# Altium footprint library M_Derogarian Altium Library.PcbLib: 137 footprints (part 5 of 9)
Each footprint in its own frame and in the unit in brackets; x right, y up, seen from the top. Pads: shape width x height; smd on the part's side, far side on the other; paste and mask are expansions set on the pad; w line width, h text height; cw(c..) or ccw(c..) is an arc to the next point about the centre after c.
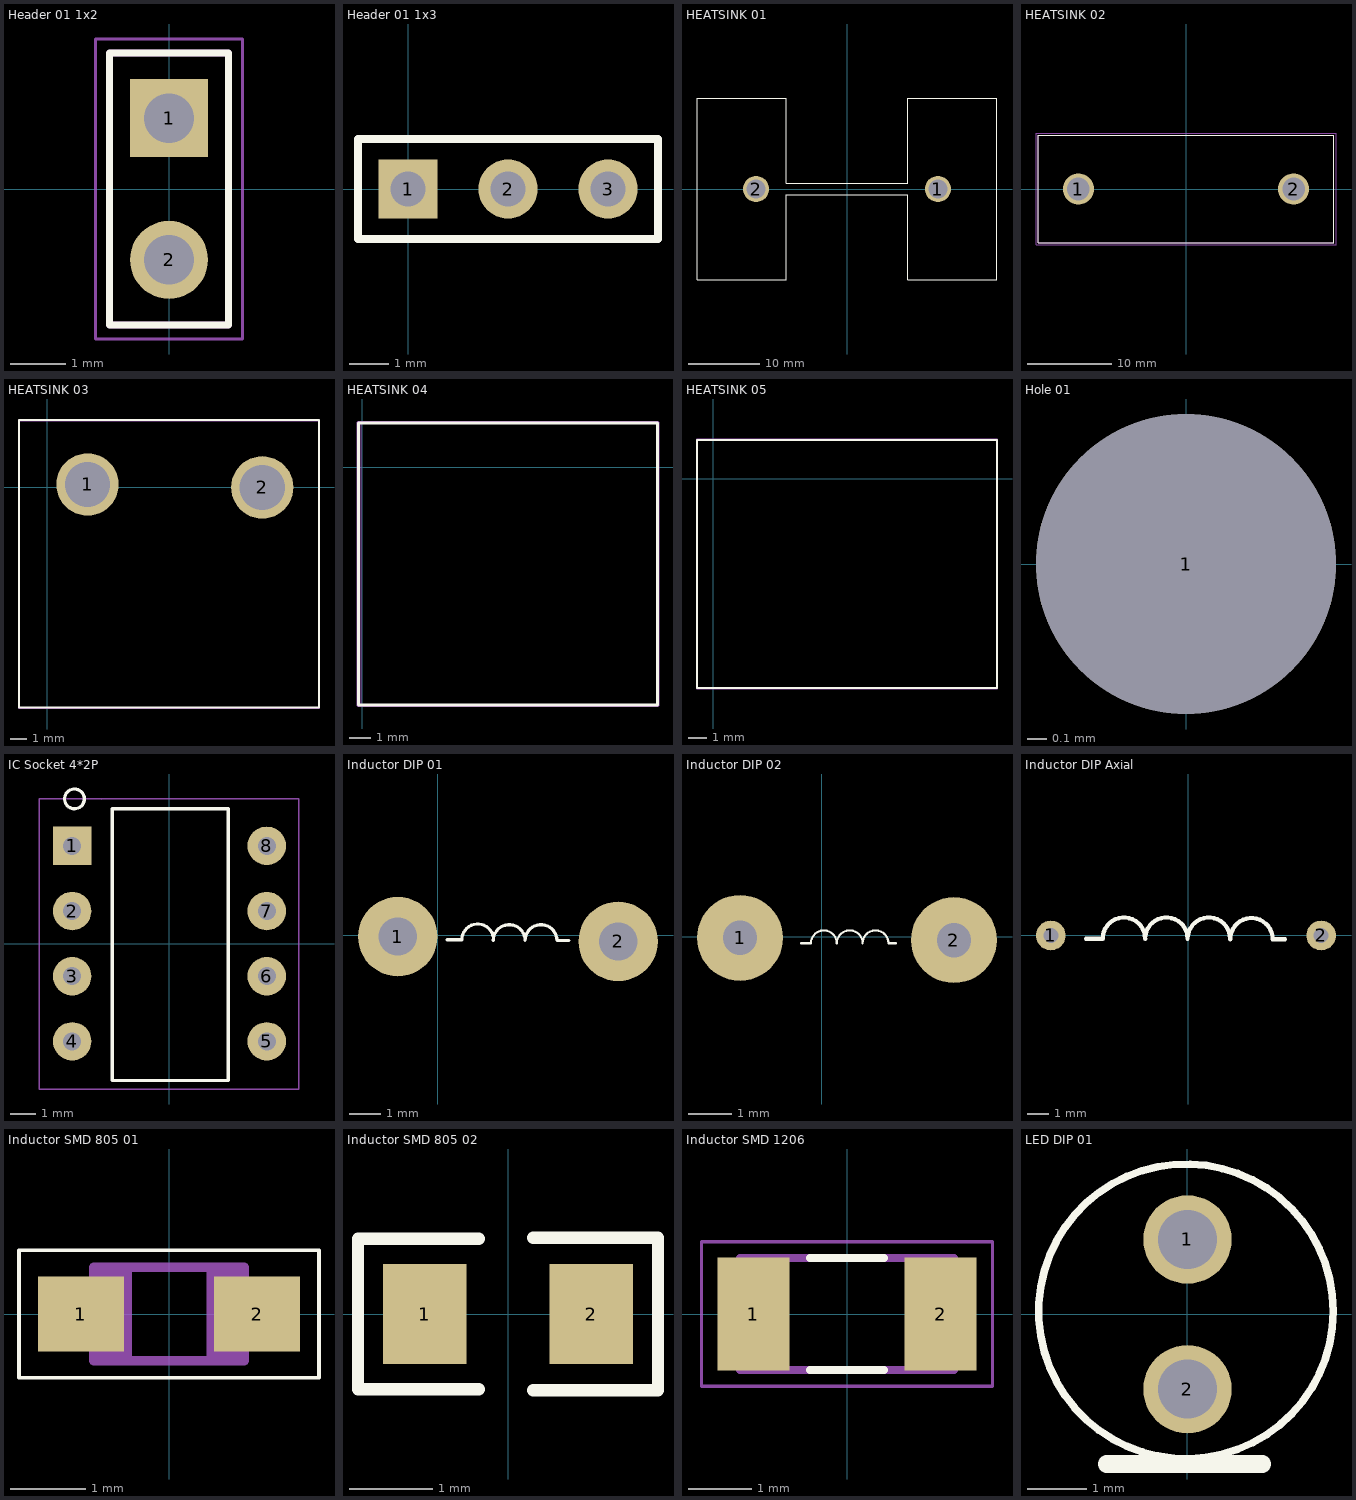
[diagram p4: the footprints below, top view; thin cyan lines are the x and y axes]

## Header 01 1x2 [mm]
pads (2):
  rect 1.398x1.398 hole 0.89: 1(0,1.27)
  round 1.398 hole 0.89: 2(0,-1.27)
Top Overlay:
  lines w0.127: -1.07,-2.44 1.07,-2.44 1.07,2.44 -1.07,2.44 -1.07,-2.44
Mechanical 13:
  lines w0.127: -1.07,-2.44 1.07,-2.44 1.07,2.44 -1.07,2.44 -1.07,-2.44
Mechanical 15:
  lines w0.05: -1.32,-2.69 1.32,-2.69 1.32,2.69 -1.32,2.69 -1.32,-2.69
3D body "5-146252-1--3DModel-STEP-1.STEP": height 11.08, standoff -2.46, extent -1.07,-2.438 1.064,2.438

## Header 01 1x3 [mm]
pads (3):
  rect 1.5x1.5 hole 0.9: 1(0,0)
  round 1.5 hole 0.9: 2(2.54,0) 3(5.08,0)
Top Overlay:
  lines w0.2: -1.27,-1.27 -1.27,1.27 6.35,1.27 6.35,-1.27 -1.27,-1.27
3D body "User Library-SMW250-03.STEP": height 7, standoff -3.5, extent -2.37,-3.489 7.53,2.9

## HEATSINK 01 [mil]
pads (2):
  round 143 hole 103: 1(500,0) 2(-500,0)
Top Overlay:
  lines w5: -825,-500 -335,-500 -335,-31 335,-31 335,-500 825,-500 825,500 335,500 335,31 -335,31 -335,500 -825,500 -825,-500
3D body "step_temp.STEP": height 2500, standoff -155.91, extent -825,-500 825,500

## HEATSINK 02 [mm]
height 38.1
pads (2):
  round 3.686 hole 2.67: 1(-12.7,0) 2(12.7,0)
Top Overlay:
  lines w0.127: -17.46,-6.35 -17.46,6.35 17.46,6.35 17.46,-6.35 -17.46,-6.35
Mechanical 13:
  lines w0.127: -17.46,-6.35 -17.46,6.35 17.46,6.35 17.46,-6.35 -17.46,-6.35
Mechanical 15:
  lines w0.05: -17.71,-6.6 -17.71,6.6 17.71,6.6 17.71,-6.6 -17.71,-6.6
3D body "step_temp.STEP": height 38.1, standoff -3.96, extent -17.46,-6.35 17.465,6.35

## HEATSINK 03 [mm]
height 38.1
pads (2):
  round 3.686 hole 2.67: 1(2.375,0.175) 2(12.7,0)
Top Overlay:
  lines w0.127: -1.675,-13 16.05,-13 16.05,3.975 -1.675,3.975 -1.675,-13
Mechanical 13:
  lines w0.127: -1.675,-13.025 16.05,-13.025 16.05,3.95 -1.675,3.95 -1.675,-13.025
Mechanical 15:
  lines w0.05: -1.675,-13 16.025,-13 16.025,3.925 -1.675,3.925 -1.675,-13
3D body "User Library-TO220_H25xW17xD16.STEP": height 25, standoff -3, extent -1.2,-12.775 15.6,3.225

## HEATSINK 04 [mm]
height 38.1
Top Overlay:
  lines w0.127: -0.175,-11.15 -0.175,2.075 13.85,2.075 13.85,-11.15 -0.175,-11.15
Mechanical 13:
  lines w0.127: -0.2,-11.175 -0.2,2.1 13.875,2.1 13.875,-11.175 -0.2,-11.175
Mechanical 15:
  lines w0.05: -0.05,-11.15 -0.05,2.075 13.85,2.075 13.85,-11.15 -0.05,-11.15
3D body "v7237c1.stp": height 19.05, standoff 0, extent 0.265,-10.85 13.475,1.85

## HEATSINK 05 [mm]
height 38.1
Top Overlay:
  lines w0.127: -0.875,-11.15 -0.875,2.075 15.125,2.075 15.125,-11.15 -0.875,-11.15
Mechanical 13:
  lines w0.127: -0.875,-11.175 -0.875,2.1 15.125,2.1 15.125,-11.175 -0.875,-11.175
Mechanical 15:
  lines w0.05: -0.85,-11.15 -0.85,2.075 15.125,2.075 15.125,-11.15 -0.85,-11.15
3D body "User Library-Heatsink-57AS.STEP": height 25, standoff 0, extent -0.625,-10.45 14.675,1.81

## Hole 01 [mil]
pads (1):
  round 60 hole 60 mask+4: 1(0,0)

## IC Socket 4*2P [mm]
pads (8):
  rect 1.5x1.5 hole 0.7: 1(-3.793,3.81)
  round 1.5 hole 0.7: 2(-3.793,1.27) 3(-3.793,-1.27) 4(-3.793,-3.81) 5(3.793,-3.81) 6(3.793,-1.27) 7(3.793,1.27) 8(3.793,3.81)
Top Overlay:
  circle w0.127: c-3.7,5.639 r0.386
  lines w0.127: 2.269,-5.334 -2.227,-5.334 -2.227,5.258 2.294,5.258 2.294,-5.334
Mechanical 15:
  lines w0.05: -2.674,5.623 -2.659,5.639 ; -5.072,-5.664 5.037,-5.664 5.037,5.639 -5.072,5.639 -5.072,-5.664
3D body "a_08-lc-tt.stp": height 6, standoff -2.25, extent -5.004,-5.105 5.156,5.055

## Inductor DIP 01 [mm]
height 2.54
pads (2):
  round 2.5 hole 1.2: 1(-1.25,-0.05) 2(5.675,-0.2)
Top Overlay:
  lines w0.1: 0.3,-0.15 0.75,-0.15 ; 0.761,-0.152 cw(c1.261,-0.152) 1.761,-0.152 ; 1.75,-0.175 cw(c2.25,-0.175) 2.75,-0.175 cw(c3.25,-0.175) 3.75,-0.175 4.125,-0.175
3D body "7447016.stp": height 18.82, standoff -12.8, extent -1.895,-8.869 6.645,8.518

## Inductor DIP 02 [mm]
height 2.54
pads (2):
  round 2 hole 0.8: 1(-1.9,-0.025) 2(3.075,-0.075)
Top Overlay:
  lines w0.05: -0.475,-0.15 -0.25,-0.15 cw(c0.05,-0.15) 0.35,-0.15 cw(c0.65,-0.15) 0.95,-0.15 cw(c1.25,-0.15) 1.55,-0.15 1.725,-0.15
3D body "User Library-Inductors  9x11.STEP": height 11.16, standoff -3, extent -3.434,-4.168 4.634,3.9

## Inductor DIP Axial [mm]
height 2.54
pads (2):
  round 1.4 hole 0.7: 1(-6.477,0) 2(6.248,0)
Top Overlay:
  lines w0.2: -4.826,-0.152 -4.04,-0.152 ; -4.039,-0.152 cw(c-3.039,-0.152) -2.039,-0.152 cw(c-1.039,-0.152) -0.039,-0.152 cw(c0.961,-0.152) 1.961,-0.152 ; 1.968,-0.178 cw(c2.968,-0.178) 3.968,-0.178 ; 3.962,-0.178 4.547,-0.178
3D body "User Library-Axial SMT Inductor Right Angle.STEP": height 4.95, standoff -4, extent -6.776,-1.147 6.624,3.353

## Inductor SMD 805 01 [mm]
pads (2):
  rect 1.15x1 smd: 1(-1.175,0) 2(1.175,0)
Top Overlay:
  lines w0.051: -2,-0.85 -2,0.85 2,0.85 2,-0.85 -2,-0.85
Mechanical 13:
  region: 1,-0.626 0.501,-0.626 0.501,0.625 1,0.625
  region: -0.5,-0.626 -1.001,-0.626 -1.001,0.625 -0.5,0.625
  lines w0.127: -1,-0.625 -1,0.625 1,0.625 1,-0.625 -1,-0.625
3D body "MLF2012K390M.STEP": height 1.04, standoff -0.01, extent -0.924,-0.6 1.076,0.65

## Inductor SMD 805 02 [mm]
pads (2):
  rect 1x1.2 smd: 1(-1,0) 2(1,0)
Top Overlay:
  lines w0.15: -0.35,-0.9 -1.8,-0.9 -1.8,0.9 -0.35,0.9 ; 0.3,-0.916 1.8,-0.916 1.8,0.916 0.3,0.916
3D body "User Library-RES_2013-0805.STEP": height 0.76, standoff 0, extent -1.15,-0.675 1.15,0.675

## Inductor SMD 1206 [mm]
pads (2):
  rect 1.13x1.77 smd: 1(-1.47,0) 2(1.47,0)
Top Overlay:
  lines w0.127: -0.58,-0.88 0.58,-0.88 ; -0.58,0.88 0.58,0.88
Mechanical 13:
  lines w0.127: -1.68,-0.88 -1.68,0.88 1.68,0.88 1.68,-0.88 -1.68,-0.88
Mechanical 15:
  lines w0.05: -2.285,-1.135 -2.285,1.135 2.285,1.135 2.285,-1.135 -2.285,-1.135
3D body "User Library-RESC3216X06N.STEP": height 0.55, standoff 0, extent -1.625,-0.774 1.575,0.826

## LED DIP 01 [mm]
pads (2):
  round 1.5 hole 1: 1(0,1.27) 2(0,-1.27)
Top Overlay:
  circle w0.127: c-0.025,0.051 r2.5
  lines w0.3: -1.372,-2.54 1.27,-2.54
3D body "CircuitWorks-LED DIP 3MM.STEP": height 6.5, standoff -2, extent -1.93,-1.623 1.87,1.877